# Altium footprint library My Footprint.PcbLib: 268 footprints (part 17 of 17)
Each footprint in its own frame and in the unit in brackets; x right, y up, seen from the top. Pads: shape width x height; smd on the part's side, far side on the other; paste and mask are expansions set on the pad; w line width, h text height; cw(c..) or ccw(c..) is an arc to the next point about the centre after c.
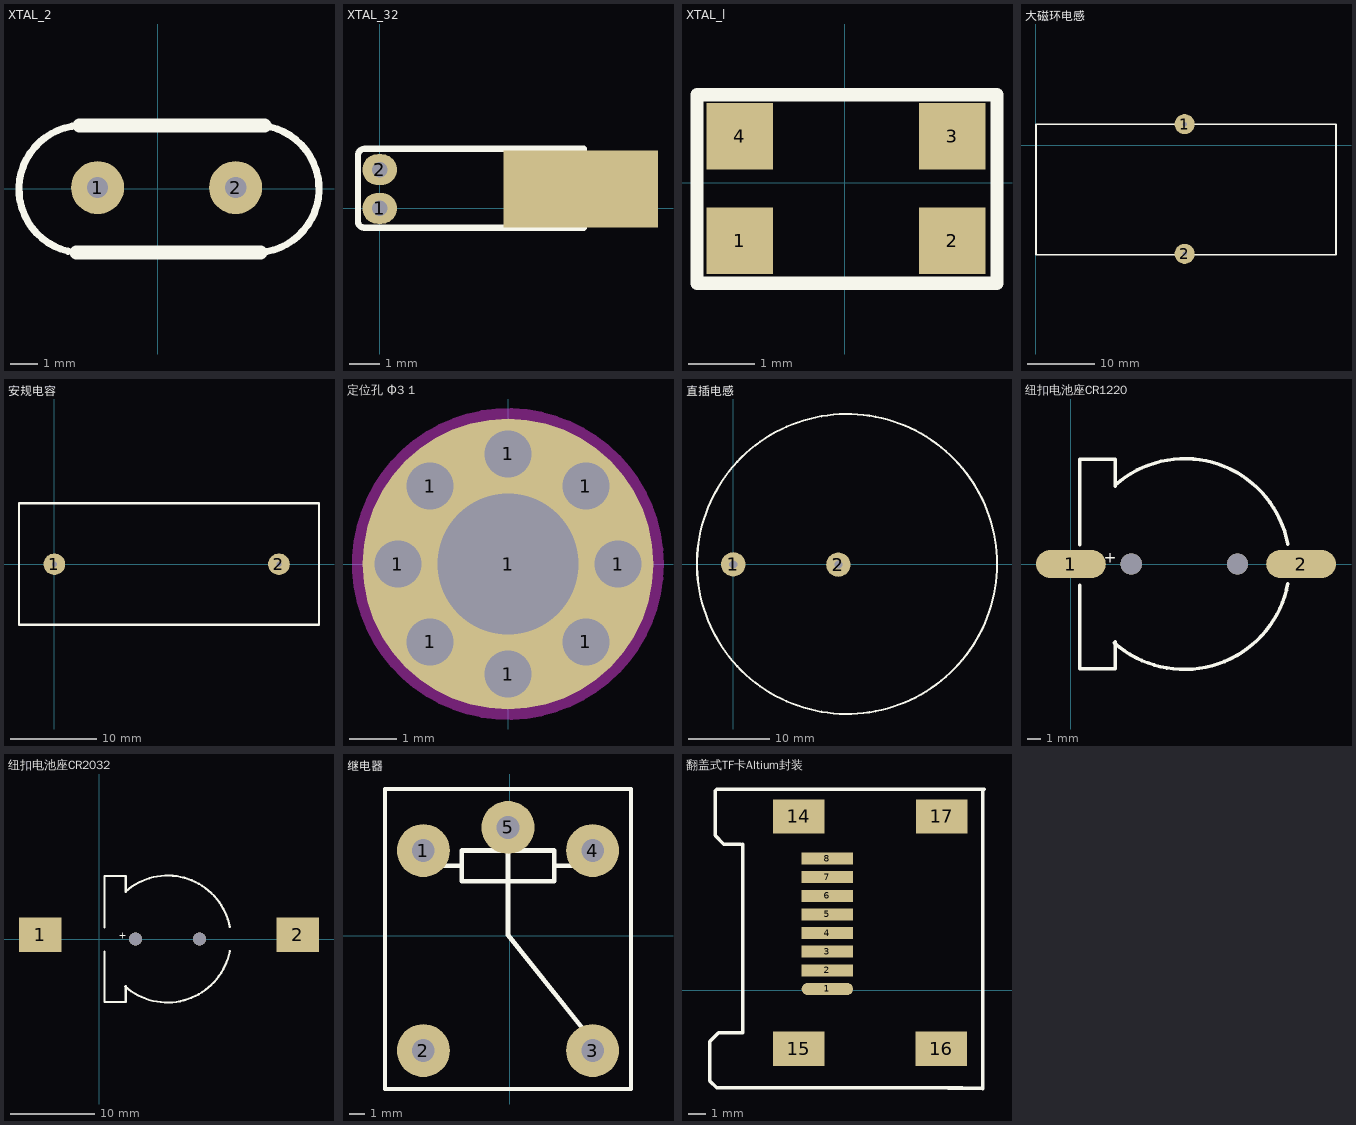
[diagram p16: the footprints below, top view; thin cyan lines are the x and y axes]

## XTAL_2 [mil]
pads (2):
  round 75 hole 30: 1(-84.92,1.38) 2(110.08,1.38)
Top Overlay:
  lines w10: -116.36,-90.31 cw(c-105.83,-0.79) -110.83,89.21 ; 142.72,-90.39 ccw(c137.72,-0.39) 148.25,89.13
  lines w19.68: -115.04,-90.12 144.96,-90.12 ; -110.83,89.21 151.18,89.21
3D body "SW3dPS-HP49US.STEP": height 137.8, standoff -157.48, extent -213.43,-90 233.43,93.07

## XTAL_32 [mil]
pads (3):
  oval 45x40 hole 20: 1(0,0) 2(0,50)
  rect 200x100 smd: ""(260,25)
Top Overlay:
  lines w8: -28,-17 -28,68.54 ; -28,-16.86 ccw(c-20,-17) -20.14,-25 ; -28,68.69 cw(c-19.54,68.54) -19.38,77 ; -20,-25 264,-25 264,77 -19.54,77
3D body "User Library-Crystal TH.STEP": height 125.98, standoff 0, extent -12.11,-40 412.11,95.83

## XTAL_l [mm]
pads (4):
  rect 1x1 smd: 1(-1.58,-0.87) 2(1.62,-0.87) 3(1.62,0.7) 4(-1.58,0.7)
Top Overlay:
  lines w0.2: -2.22,-1.51 -2.22,1.32 2.29,1.32 2.29,-1.51 -2.22,-1.51

## 大磁环电感 [mm]
pads (2):
  round 3 hole 0.7: 1(22.174,3.175) 2(22.174,-16.129)
Top Overlay:
  lines w0.254: 0.051,-16.281 44.704,-16.281 44.704,3.175 0.051,3.175 0.051,-16.281
3D body: height 39.84, standoff 0, extent 2.239,-13.73 42.16,1.27

## 安规电容 [mm]
pads (2):
  round 2.5 hole 0.6: 1(0,-0.025) 2(25.933,-0.025)
Top Overlay:
  lines w0.254: -4.089,-7.01 30.556,-7.01 30.556,7.01 -4.089,7.01 -4.089,-7.01

## 定位孔 Φ3 1 [mm]
pads (9):
  round 1 hole 1: 1(-2.35,0) 1(-1.662,-1.662) 1(-1.662,1.662) 1(0,-2.35) 1(0,2.35) 1(1.662,-1.662) 1(1.662,1.662) 1(2.35,0)
  round 6.2 hole 3: 1(0,0)
Keep-Out Layer:
  circle w0.254: c0,0 r3.2

## 直插电感 [mm] "L?"
pads (2):
  round 3 hole 1: 1(0,0) 2(12.954,-0.025)
Top Overlay:
  circle w0.254: c14.021,0.051 r18.491

## 纽扣电池座CR1220 [mm] "小的"
height 5
pads (2):
  oval 5x2 smd: 1(0,0) 2(16.5,0)
via 11.938,0 diameter 1.524 hole 1.524
via 4.318,0 diameter 1.524 hole 1.524
Top Overlay:
  lines w0.254: 0.635,-1.524 0.635,-7.493 3.175,-7.493 3.175,-5.588 ; 0.635,1.397 0.635,7.493 3.175,7.493 3.175,5.588 ; 3.115,-5.655 ccw(c8.128,0) 15.553,-1.408 ; 3.175,5.659 cw(c8.159,0.035) 15.543,1.43
  text "+" at 3.302,0.762 h0.81
3D body "User Library-cr1220.STEP": height 3.94, standoff -1, extent -1,-7.5 17.5,7.497

## 纽扣电池座CR2032 [mil]
height 196.85
pads (2):
  rect 200x160 smd: 1(-275,20) 2(930,20)
via 470,0 diameter 60 hole 60
via 170,0 diameter 60 hole 60
Top Overlay:
  lines w10: 25,-60 25,-295 125,-295 125,-220 ; 25,55 25,295 125,295 125,220 ; 122.64,-222.66 ccw(c320,0) 612.32,-55.44 ; 125,222.79 cw(c321.24,1.4) 611.94,56.31
  text "+" at 130,30 h32
3D body "CR2032.STEP": height 208.66, standoff 0, extent -304.92,-373.7 954.92,413.7

## 继电器 [mm]
pads (5):
  round 3.5 hole 1.5: 1(-5.69,5.613) 2(-5.69,-7.595) 3(5.486,-7.595) 4(5.486,5.613) 5(-0.102,7.137)
Top Overlay:
  lines w0.254: -8.23,-10.135 8.026,-10.135 8.026,9.677 -8.23,9.677 -8.23,-10.135
  lines w0.305: -6.198,4.597 -3.15,4.597 ; -5.69,4.597 -5.69,5.613 ; -0.102,7.137 -0.102,0.025 5.994,-7.595 ; 2.946,4.597 5.994,4.597 ; 5.486,4.597 5.486,5.613 ; -3.15,3.581 2.946,3.581 2.946,5.613 -3.15,5.613 -3.15,3.581

## 翻盖式TF卡Altium封装 [mm]
pads (12):
  oval 3x0.7 smd: 1(56.085,0.065)
  rect 3x0.7 smd: 2(56.085,1.151) 3(56.085,2.237) 4(56.085,3.322) 5(56.085,4.408) 6(56.085,5.494) 7(56.085,6.58) 8(56.085,7.665)
  rect 3x2 smd: 14(54.41,10.115) 15(54.41,-3.41) 16(62.71,-3.41) 17(62.735,10.115)
Top Overlay:
  lines w0.1: 63.035,11.665 63.585,11.665
  lines w0.2: 51.042,8.505 50.042,8.505 49.542,9.005 49.542,11.605 49.642,11.705 63.942,11.705 ; 51.142,-2.395 51.142,-2.295 51.142,8.505 ; 51.158,-2.495 49.742,-2.495 49.242,-2.995 49.242,-5.295 49.642,-5.695 63.942,-5.695 ; 63.135,-5.71 65.085,-5.71 ; 63.26,11.715 63.285,11.69 65.21,11.69 ; 65.135,-5.76 65.135,11.615

## 蓝牙 [mil]